# Altium schematic symbol library SCHLIB.SchLib: 2608 symbols (part 11 of 20)
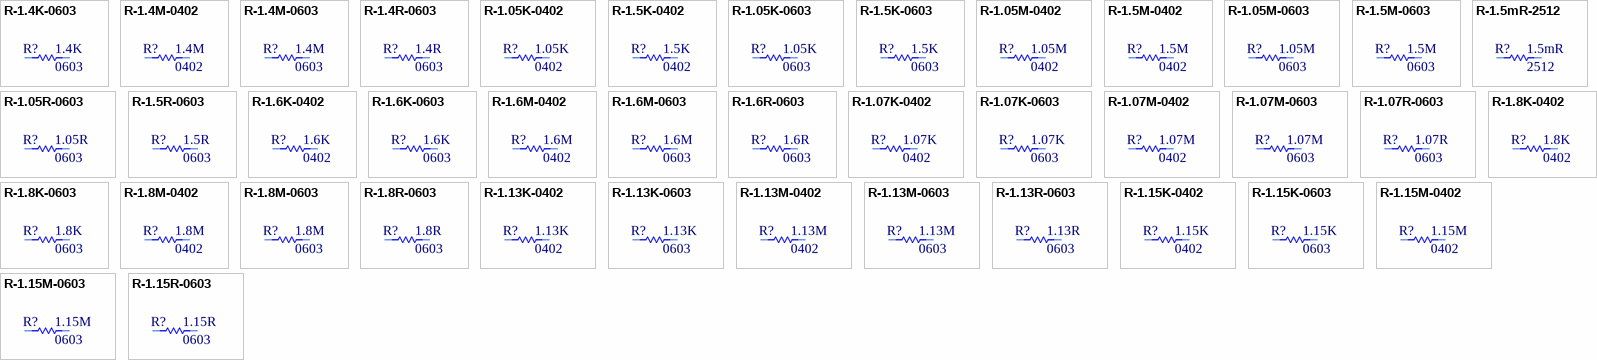
[diagram p93: symbols R-1.4K-0603 to R-1.15R-0603]

## R-1.05M-0603
designator R?, comment Package: 0603  (hidden comment: 1.05M)
RES SMD 1.05M OHM 1% 1/10W 0603; Manufacturer Part Number: CRCW06031M05FKEA; Manufacturer: Vishay Dale; Tolerance: 0.01; Power: 0.1W; Temperature Coefficient: ±100ppm/°C; Object  Type: Part; Design Item ID: R-1.05M-0603; Value: 1.05M; Composition: Thick Film; Features: Automotive AEC-Q200; Operating Temperature: -55°C ~ 155°C; Height - Seated (Max): 0.50mm; Category: Resistor
footprint R0603
pins: 1, 2

## R-1.5M-0603
designator R?, comment Package: 0603  (hidden comment: 1.5M)
RES SMD 1.5M OHM 1% 1/10W 0603; Manufacturer Part Number: CRCW06031M50FKEA; Manufacturer: Vishay Dale; Tolerance: 0.01; Power: 0.1W; Temperature Coefficient: ±100ppm/°C; Object  Type: Part; Design Item ID: R-1.5M-0603; Value: 1.5M; Composition: Thick Film; Features: Automotive AEC-Q200; Operating Temperature: -55°C ~ 155°C; Height - Seated (Max): 0.50mm; Category: Resistor
footprint R0603
pins: 1, 2

## R-1.5mR-2512
designator R?, comment Package: 2512  (hidden comment: 1.5mR)
RES 0.0015 OHM 1% 1W 2512; Manufacturer Part Number: WSL25121L500FEA; Manufacturer: Vishay Dale; Tolerance: 0.01; Temperature Coefficient: ±275ppm/°C; Object  Type: Part; Design Item ID: R-1.5mR-2512; Value: 1.5mR; Power: 1W; Composition: Metal Element; Features: Automotive AEC-Q200, Current Sense, Moisture Resistant, Pulse Withstanding; Operating Temperature: -65°C ~ 170°C; Height - Seated (Max): 0.89mm; Category: Resistor
footprint R2512
pins: 1, 2

## R-1.05R-0603
designator R?, comment Package: 0603  (hidden comment: 1.05R)
RES SMD 1.05 OHM 1% 1/10W 0603; Manufacturer Part Number: CRCW06031R05FKEA; Manufacturer: Vishay Dale; Tolerance: 0.01; Power: 0.1W; Temperature Coefficient: ±100ppm/°C; Object  Type: Part; Design Item ID: R-1.05R-0603; Value: 1.05R; Composition: Thick Film; Features: Automotive AEC-Q200; Operating Temperature: -55°C ~ 155°C; Height - Seated (Max): 0.50mm; Category: Resistor
footprint R0603
pins: 1, 2

## R-1.5R-0603
designator R?, comment Package: 0603  (hidden comment: 1.5R)
RES SMD 1.5 OHM 1% 1/10W 0603; Manufacturer Part Number: CRCW06031R50FKEA; Manufacturer: Vishay Dale; Tolerance: 0.01; Power: 0.1W; Temperature Coefficient: ±100ppm/°C; Object  Type: Part; Design Item ID: R-1.5R-0603; Value: 1.5R; Composition: Thick Film; Features: Automotive AEC-Q200; Operating Temperature: -55°C ~ 155°C; Height - Seated (Max): 0.50mm; Category: Resistor
footprint R0603
pins: 1, 2

## R-1.6K-0402
designator R?, comment Package: 0402  (hidden comment: 1.6K)
RES 1.6K OHM 1% 1/16W 0402; Manufacturer Part Number: RC0402FR-071K6L; Manufacturer: YAGEO; Tolerance: 0.01; Power: 0.063W; Temperature Coefficient: ±100ppm/°C; Object  Type: Part; Design Item ID: R-1.6K-0402; Value: 1.6K; Composition: Thick Film; Features: Moisture Resistant; Operating Temperature: -55°C ~ 155°C; Height - Seated (Max): 0.40mm; Category: Resistor
footprint R0402
pins: 1, 2

## R-1.6K-0603
designator R?, comment Package: 0603  (hidden comment: 1.6K)
RES SMD 1.6K OHM 1% 1/10W 0603; Manufacturer Part Number: CRCW06031K60FKEA; Manufacturer: Vishay Dale; Tolerance: 0.01; Power: 0.1W; Temperature Coefficient: ±100ppm/°C; Object  Type: Part; Design Item ID: R-1.6K-0603; Value: 1.6K; Composition: Thick Film; Features: Automotive AEC-Q200; Operating Temperature: -55°C ~ 155°C; Height - Seated (Max): 0.50mm; Category: Resistor
footprint R0603
pins: 1, 2

## R-1.6M-0402
designator R?, comment Package: 0402  (hidden comment: 1.6M)
RES 1.6M OHM 1% 1/16W 0402; Manufacturer Part Number: RC0402FR-071M6L; Manufacturer: YAGEO; Tolerance: 0.01; Power: 0.063W; Temperature Coefficient: ±100ppm/°C; Object  Type: Part; Design Item ID: R-1.6M-0402; Value: 1.6M; Composition: Thick Film; Features: Moisture Resistant; Operating Temperature: -55°C ~ 155°C; Height - Seated (Max): 0.40mm; Category: Resistor
footprint R0402
pins: 1, 2

## R-1.6M-0603
designator R?, comment Package: 0603  (hidden comment: 1.6M)
RES SMD 1.6M OHM 1% 1/10W 0603; Manufacturer Part Number: CRCW06031M60FKEA; Manufacturer: Vishay Dale; Tolerance: 0.01; Power: 0.1W; Temperature Coefficient: ±100ppm/°C; Object  Type: Part; Design Item ID: R-1.6M-0603; Value: 1.6M; Composition: Thick Film; Features: Automotive AEC-Q200; Operating Temperature: -55°C ~ 155°C; Height - Seated (Max): 0.50mm; Category: Resistor
footprint R0603
pins: 1, 2

## R-1.6R-0603
designator R?, comment Package: 0603  (hidden comment: 1.6R)
RES SMD 1.6 OHM 1% 1/10W 0603; Manufacturer Part Number: CRCW06031R60FKEA; Manufacturer: Vishay Dale; Tolerance: 0.01; Power: 0.1W; Temperature Coefficient: ±100ppm/°C; Object  Type: Part; Design Item ID: R-1.6R-0603; Value: 1.6R; Composition: Thick Film; Features: Automotive AEC-Q200; Operating Temperature: -55°C ~ 155°C; Height - Seated (Max): 0.50mm; Category: Resistor
footprint R0603
pins: 1, 2

## R-1.07K-0402
designator R?, comment Package: 0402  (hidden comment: 1.07K)
RES 1.07K OHM 1% 1/16W 0402; Manufacturer Part Number: RC0402FR-071K07L; Manufacturer: YAGEO; Tolerance: 0.01; Power: 0.063W; Temperature Coefficient: ±100ppm/°C; Object  Type: Part; Design Item ID: R-1.07K-0402; Value: 1.07K; Composition: Thick Film; Features: Moisture Resistant; Operating Temperature: -55°C ~ 155°C; Height - Seated (Max): 0.40mm; Category: Resistor
footprint R0402
pins: 1, 2

## R-1.07K-0603
designator R?, comment Package: 0603  (hidden comment: 1.07K)
RES SMD 1.07K OHM 1% 1/10W 0603; Manufacturer Part Number: CRCW06031K07FKEA; Manufacturer: Vishay Dale; Tolerance: 0.01; Power: 0.1W; Temperature Coefficient: ±100ppm/°C; Object  Type: Part; Design Item ID: R-1.07K-0603; Value: 1.07K; Composition: Thick Film; Features: Automotive AEC-Q200; Operating Temperature: -55°C ~ 155°C; Height - Seated (Max): 0.50mm; Category: Resistor
footprint R0603
pins: 1, 2

## R-1.07M-0402
designator R?, comment Package: 0402  (hidden comment: 1.07M)
RES 1.07M OHM 1% 1/16W 0402; Manufacturer Part Number: RC0402FR-071M07L; Manufacturer: YAGEO; Tolerance: 0.01; Power: 0.063W; Temperature Coefficient: ±100ppm/°C; Object  Type: Part; Design Item ID: R-1.07M-0402; Value: 1.07M; Composition: Thick Film; Features: Moisture Resistant; Operating Temperature: -55°C ~ 155°C; Height - Seated (Max): 0.40mm; Category: Resistor
footprint R0402
pins: 1, 2

## R-1.07M-0603
designator R?, comment Package: 0603  (hidden comment: 1.07M)
RES SMD 1.07M OHM 1% 1/10W 0603; Manufacturer Part Number: CRCW06031M07FKEA; Manufacturer: Vishay Dale; Tolerance: 0.01; Power: 0.1W; Temperature Coefficient: ±100ppm/°C; Object  Type: Part; Design Item ID: R-1.07M-0603; Value: 1.07M; Composition: Thick Film; Features: Automotive AEC-Q200; Operating Temperature: -55°C ~ 155°C; Height - Seated (Max): 0.50mm; Category: Resistor
footprint R0603
pins: 1, 2

## R-1.07R-0603
designator R?, comment Package: 0603  (hidden comment: 1.07R)
RES SMD 1.07 OHM 1% 1/10W 0603; Manufacturer Part Number: CRCW06031R07FKEA; Manufacturer: Vishay Dale; Tolerance: 0.01; Power: 0.1W; Temperature Coefficient: ±100ppm/°C; Object  Type: Part; Design Item ID: R-1.07R-0603; Value: 1.07R; Composition: Thick Film; Features: Automotive AEC-Q200; Operating Temperature: -55°C ~ 155°C; Height - Seated (Max): 0.50mm; Category: Resistor
footprint R0603
pins: 1, 2

## R-1.8K-0402
designator R?, comment Package: 0402  (hidden comment: 1.8K)
RES 1.8K OHM 1% 1/16W 0402; Manufacturer Part Number: RC0402FR-071K8L; Manufacturer: YAGEO; Tolerance: 0.01; Power: 0.063W; Temperature Coefficient: ±100ppm/°C; Object  Type: Part; Design Item ID: R-1.8K-0402; Value: 1.8K; Composition: Thick Film; Features: Moisture Resistant; Operating Temperature: -55°C ~ 155°C; Height - Seated (Max): 0.40mm; Category: Resistor
footprint R0402
pins: 1, 2

## R-1.8K-0603
designator R?, comment Package: 0603  (hidden comment: 1.8K)
RES SMD 1.8K OHM 1% 1/10W 0603; Manufacturer Part Number: CRCW06031K80FKEA; Manufacturer: Vishay Dale; Tolerance: 0.01; Power: 0.1W; Temperature Coefficient: ±100ppm/°C; Object  Type: Part; Design Item ID: R-1.8K-0603; Value: 1.8K; Composition: Thick Film; Features: Automotive AEC-Q200; Operating Temperature: -55°C ~ 155°C; Height - Seated (Max): 0.50mm; Category: Resistor
footprint R0603
pins: 1, 2

## R-1.8M-0402
designator R?, comment Package: 0402  (hidden comment: 1.8M)
RES 1.8M OHM 1% 1/16W 0402; Manufacturer Part Number: RC0402FR-071M8L; Manufacturer: YAGEO; Tolerance: 0.01; Power: 0.063W; Temperature Coefficient: ±100ppm/°C; Object  Type: Part; Design Item ID: R-1.8M-0402; Value: 1.8M; Composition: Thick Film; Features: Moisture Resistant; Operating Temperature: -55°C ~ 155°C; Height - Seated (Max): 0.40mm; Category: Resistor
footprint R0402
pins: 1, 2

## R-1.8M-0603
designator R?, comment Package: 0603  (hidden comment: 1.8M)
RES SMD 1.8M OHM 1% 1/10W 0603; Manufacturer Part Number: CRCW06031M80FKEA; Manufacturer: Vishay Dale; Tolerance: 0.01; Power: 0.1W; Temperature Coefficient: ±100ppm/°C; Object  Type: Part; Design Item ID: R-1.8M-0603; Value: 1.8M; Composition: Thick Film; Features: Automotive AEC-Q200; Operating Temperature: -55°C ~ 155°C; Height - Seated (Max): 0.50mm; Category: Resistor
footprint R0603
pins: 1, 2

## R-1.8R-0603
designator R?, comment Package: 0603  (hidden comment: 1.8R)
RES SMD 1.8 OHM 1% 1/10W 0603; Manufacturer Part Number: CRCW06031R80FKEA; Manufacturer: Vishay Dale; Tolerance: 0.01; Power: 0.1W; Temperature Coefficient: ±100ppm/°C; Object  Type: Part; Design Item ID: R-1.8R-0603; Value: 1.8R; Composition: Thick Film; Features: Automotive AEC-Q200; Operating Temperature: -55°C ~ 155°C; Height - Seated (Max): 0.50mm; Category: Resistor
footprint R0603
pins: 1, 2

## R-1.13K-0402
designator R?, comment Package: 0402  (hidden comment: 1.13K)
RES 1.13K OHM 1% 1/16W 0402; Manufacturer Part Number: RC0402FR-071K13L; Manufacturer: YAGEO; Tolerance: 0.01; Power: 0.063W; Temperature Coefficient: ±100ppm/°C; Object  Type: Part; Design Item ID: R-1.13K-0402; Value: 1.13K; Composition: Thick Film; Features: Moisture Resistant; Operating Temperature: -55°C ~ 155°C; Height - Seated (Max): 0.40mm; Category: Resistor
footprint R0402
pins: 1, 2

## R-1.13K-0603
designator R?, comment Package: 0603  (hidden comment: 1.13K)
RES SMD 1.13K OHM 1% 1/10W 0603; Manufacturer Part Number: CRCW06031K13FKEA; Manufacturer: Vishay Dale; Tolerance: 0.01; Power: 0.1W; Temperature Coefficient: ±100ppm/°C; Object  Type: Part; Design Item ID: R-1.13K-0603; Value: 1.13K; Composition: Thick Film; Features: Automotive AEC-Q200; Operating Temperature: -55°C ~ 155°C; Height - Seated (Max): 0.50mm; Category: Resistor
footprint R0603
pins: 1, 2

## R-1.13M-0402
designator R?, comment Package: 0402  (hidden comment: 1.13M)
RES 1.13M OHM 1% 1/16W 0402; Manufacturer Part Number: RC0402FR-071M13L; Manufacturer: YAGEO; Tolerance: 0.01; Power: 0.063W; Temperature Coefficient: ±100ppm/°C; Object  Type: Part; Design Item ID: R-1.13M-0402; Value: 1.13M; Composition: Thick Film; Features: Moisture Resistant; Operating Temperature: -55°C ~ 155°C; Height - Seated (Max): 0.40mm; Category: Resistor
footprint R0402
pins: 1, 2

## R-1.13M-0603
designator R?, comment Package: 0603  (hidden comment: 1.13M)
RES SMD 1.13M OHM 1% 1/10W 0603; Manufacturer Part Number: CRCW06031M13FKEA; Manufacturer: Vishay Dale; Tolerance: 0.01; Power: 0.1W; Temperature Coefficient: ±100ppm/°C; Object  Type: Part; Design Item ID: R-1.13M-0603; Value: 1.13M; Composition: Thick Film; Features: Automotive AEC-Q200; Operating Temperature: -55°C ~ 155°C; Height - Seated (Max): 0.50mm; Category: Resistor
footprint R0603
pins: 1, 2

## R-1.13R-0603
designator R?, comment Package: 0603  (hidden comment: 1.13R)
RES SMD 1.13 OHM 1% 1/10W 0603; Manufacturer Part Number: CRCW06031R13FKEA; Manufacturer: Vishay Dale; Tolerance: 0.01; Power: 0.1W; Temperature Coefficient: ±100ppm/°C; Object  Type: Part; Design Item ID: R-1.13R-0603; Value: 1.13R; Composition: Thick Film; Features: Automotive AEC-Q200; Operating Temperature: -55°C ~ 155°C; Height - Seated (Max): 0.50mm; Category: Resistor
footprint R0603
pins: 1, 2

## R-1.15K-0402
designator R?, comment Package: 0402  (hidden comment: 1.15K)
RES 1.15K OHM 1% 1/16W 0402; Manufacturer Part Number: RC0402FR-071K15L; Manufacturer: YAGEO; Tolerance: 0.01; Power: 0.063W; Temperature Coefficient: ±100ppm/°C; Object  Type: Part; Design Item ID: R-1.15K-0402; Value: 1.15K; Composition: Thick Film; Features: Moisture Resistant; Operating Temperature: -55°C ~ 155°C; Height - Seated (Max): 0.40mm; Category: Resistor
footprint R0402
pins: 1, 2

## R-1.15K-0603
designator R?, comment Package: 0603  (hidden comment: 1.15K)
RES SMD 1.15K OHM 1% 1/10W 0603; Manufacturer Part Number: CRCW06031K15FKEA; Manufacturer: Vishay Dale; Tolerance: 0.01; Power: 0.1W; Temperature Coefficient: ±100ppm/°C; Object  Type: Part; Design Item ID: R-1.15K-0603; Value: 1.15K; Composition: Thick Film; Features: Automotive AEC-Q200; Operating Temperature: -55°C ~ 155°C; Height - Seated (Max): 0.50mm; Category: Resistor
footprint R0603
pins: 1, 2

## R-1.15M-0402
designator R?, comment Package: 0402  (hidden comment: 1.15M)
RES 1.15M OHM 1% 1/16W 0402; Manufacturer Part Number: RC0402FR-071M15L; Manufacturer: YAGEO; Tolerance: 0.01; Power: 0.063W; Temperature Coefficient: ±100ppm/°C; Object  Type: Part; Design Item ID: R-1.15M-0402; Value: 1.15M; Composition: Thick Film; Features: Moisture Resistant; Operating Temperature: -55°C ~ 155°C; Height - Seated (Max): 0.40mm; Category: Resistor
footprint R0402
pins: 1, 2

## R-1.15M-0603
designator R?, comment Package: 0603  (hidden comment: 1.15M)
RES SMD 1.15M OHM 1% 1/10W 0603; Manufacturer Part Number: CRCW06031M15FKEA; Manufacturer: Vishay Dale; Tolerance: 0.01; Power: 0.1W; Temperature Coefficient: ±100ppm/°C; Object  Type: Part; Design Item ID: R-1.15M-0603; Value: 1.15M; Composition: Thick Film; Features: Automotive AEC-Q200; Operating Temperature: -55°C ~ 155°C; Height - Seated (Max): 0.50mm; Category: Resistor
footprint R0603
pins: 1, 2

## R-1.15R-0603
designator R?, comment Package: 0603  (hidden comment: 1.15R)
RES SMD 1.15 OHM 1% 1/10W 0603; Manufacturer Part Number: CRCW06031R15FKEA; Manufacturer: Vishay Dale; Tolerance: 0.01; Power: 0.1W; Temperature Coefficient: ±100ppm/°C; Object  Type: Part; Design Item ID: R-1.15R-0603; Value: 1.15R; Composition: Thick Film; Features: Automotive AEC-Q200; Operating Temperature: -55°C ~ 155°C; Height - Seated (Max): 0.50mm; Category: Resistor
footprint R0603
pins: 1, 2

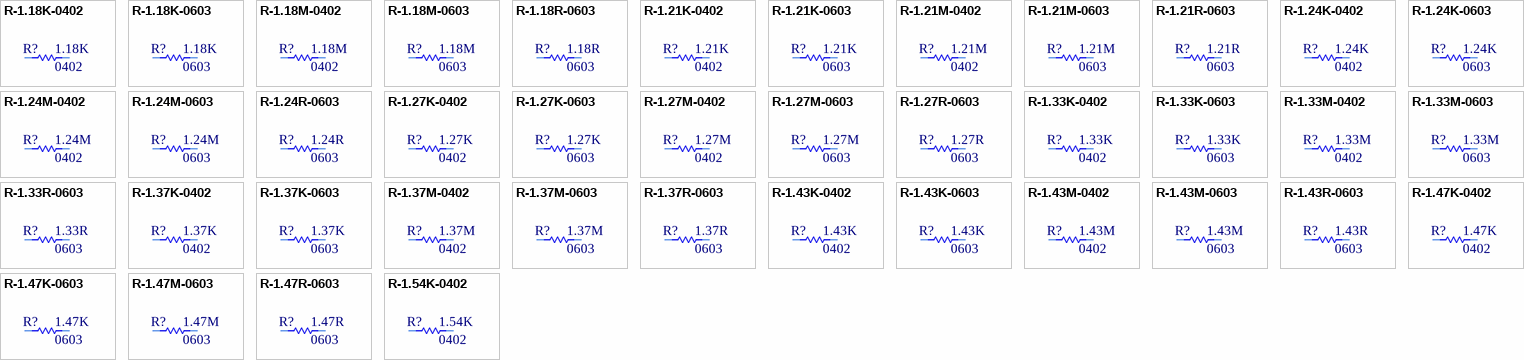
[diagram p45: symbols R-1.18K-0402 to R-1.54K-0402]

## R-1.18K-0402
designator R?, comment Package: 0402  (hidden comment: 1.18K)
RES 1.18K OHM 1% 1/16W 0402; Manufacturer Part Number: RC0402FR-071K18L; Manufacturer: YAGEO; Tolerance: 0.01; Power: 0.063W; Temperature Coefficient: ±100ppm/°C; Object  Type: Part; Design Item ID: R-1.18K-0402; Value: 1.18K; Composition: Thick Film; Features: Moisture Resistant; Operating Temperature: -55°C ~ 155°C; Height - Seated (Max): 0.40mm; Category: Resistor
footprint R0402
pins: 1, 2

## R-1.18K-0603
designator R?, comment Package: 0603  (hidden comment: 1.18K)
RES SMD 1.18K OHM 1% 1/10W 0603; Manufacturer Part Number: CRCW06031K18FKEA; Manufacturer: Vishay Dale; Tolerance: 0.01; Power: 0.1W; Temperature Coefficient: ±100ppm/°C; Object  Type: Part; Design Item ID: R-1.18K-0603; Value: 1.18K; Composition: Thick Film; Features: Automotive AEC-Q200; Operating Temperature: -55°C ~ 155°C; Height - Seated (Max): 0.50mm; Category: Resistor
footprint R0603
pins: 1, 2

## R-1.18M-0402
designator R?, comment Package: 0402  (hidden comment: 1.18M)
RES 1.18M OHM 1% 1/16W 0402; Manufacturer Part Number: RC0402FR-071M18L; Manufacturer: YAGEO; Tolerance: 0.01; Power: 0.063W; Temperature Coefficient: ±100ppm/°C; Object  Type: Part; Design Item ID: R-1.18M-0402; Value: 1.18M; Composition: Thick Film; Features: Moisture Resistant; Operating Temperature: -55°C ~ 155°C; Height - Seated (Max): 0.40mm; Category: Resistor
footprint R0402
pins: 1, 2

## R-1.18M-0603
designator R?, comment Package: 0603  (hidden comment: 1.18M)
RES SMD 1.18M OHM 1% 1/10W 0603; Manufacturer Part Number: CRCW06031M18FKEA; Manufacturer: Vishay Dale; Tolerance: 0.01; Power: 0.1W; Temperature Coefficient: ±100ppm/°C; Object  Type: Part; Design Item ID: R-1.18M-0603; Value: 1.18M; Composition: Thick Film; Features: Automotive AEC-Q200; Operating Temperature: -55°C ~ 155°C; Height - Seated (Max): 0.50mm; Category: Resistor
footprint R0603
pins: 1, 2

## R-1.18R-0603
designator R?, comment Package: 0603  (hidden comment: 1.18R)
RES SMD 1.18 OHM 1% 1/10W 0603; Manufacturer Part Number: CRCW06031R18FKEA; Manufacturer: Vishay Dale; Tolerance: 0.01; Power: 0.1W; Temperature Coefficient: ±100ppm/°C; Object  Type: Part; Design Item ID: R-1.18R-0603; Value: 1.18R; Composition: Thick Film; Features: Automotive AEC-Q200; Operating Temperature: -55°C ~ 155°C; Height - Seated (Max): 0.50mm; Category: Resistor
footprint R0603
pins: 1, 2

## R-1.21K-0402
designator R?, comment Package: 0402  (hidden comment: 1.21K)
RES 1.21K OHM 1% 1/16W 0402; Manufacturer Part Number: RC0402FR-071K21L; Manufacturer: YAGEO; Tolerance: 0.01; Power: 0.063W; Temperature Coefficient: ±100ppm/°C; Object  Type: Part; Design Item ID: R-1.21K-0402; Value: 1.21K; Composition: Thick Film; Features: Moisture Resistant; Operating Temperature: -55°C ~ 155°C; Height - Seated (Max): 0.40mm; Category: Resistor
footprint R0402
pins: 1, 2

## R-1.21K-0603
designator R?, comment Package: 0603  (hidden comment: 1.21K)
RES SMD 1.21K OHM 1% 1/10W 0603; Manufacturer Part Number: CRCW06031K21FKEA; Manufacturer: Vishay Dale; Tolerance: 0.01; Power: 0.1W; Temperature Coefficient: ±100ppm/°C; Object  Type: Part; Design Item ID: R-1.21K-0603; Value: 1.21K; Composition: Thick Film; Features: Automotive AEC-Q200; Operating Temperature: -55°C ~ 155°C; Height - Seated (Max): 0.50mm; Category: Resistor
footprint R0603
pins: 1, 2

## R-1.21M-0402
designator R?, comment Package: 0402  (hidden comment: 1.21M)
RES 1.21M OHM 1% 1/16W 0402; Manufacturer Part Number: RC0402FR-071M21L; Manufacturer: YAGEO; Tolerance: 0.01; Power: 0.063W; Temperature Coefficient: ±100ppm/°C; Object  Type: Part; Design Item ID: R-1.21M-0402; Value: 1.21M; Composition: Thick Film; Features: Moisture Resistant; Operating Temperature: -55°C ~ 155°C; Height - Seated (Max): 0.40mm; Category: Resistor
footprint R0402
pins: 1, 2

## R-1.21M-0603
designator R?, comment Package: 0603  (hidden comment: 1.21M)
RES SMD 1.21M OHM 1% 1/10W 0603; Manufacturer Part Number: CRCW06031M21FKEA; Manufacturer: Vishay Dale; Tolerance: 0.01; Power: 0.1W; Temperature Coefficient: ±100ppm/°C; Object  Type: Part; Design Item ID: R-1.21M-0603; Value: 1.21M; Composition: Thick Film; Features: Automotive AEC-Q200; Operating Temperature: -55°C ~ 155°C; Height - Seated (Max): 0.50mm; Category: Resistor
footprint R0603
pins: 1, 2

## R-1.21R-0603
designator R?, comment Package: 0603  (hidden comment: 1.21R)
RES SMD 1.21 OHM 1% 1/10W 0603; Manufacturer Part Number: CRCW06031R21FKEA; Manufacturer: Vishay Dale; Tolerance: 0.01; Power: 0.1W; Temperature Coefficient: ±100ppm/°C; Object  Type: Part; Design Item ID: R-1.21R-0603; Value: 1.21R; Composition: Thick Film; Features: Automotive AEC-Q200; Operating Temperature: -55°C ~ 155°C; Height - Seated (Max): 0.50mm; Category: Resistor
footprint R0603
pins: 1, 2

## R-1.24K-0402
designator R?, comment Package: 0402  (hidden comment: 1.24K)
RES 1.24K OHM 1% 1/16W 0402; Manufacturer Part Number: RC0402FR-071K24L; Manufacturer: YAGEO; Tolerance: 0.01; Power: 0.063W; Temperature Coefficient: ±100ppm/°C; Object  Type: Part; Design Item ID: R-1.24K-0402; Value: 1.24K; Composition: Thick Film; Features: Moisture Resistant; Operating Temperature: -55°C ~ 155°C; Height - Seated (Max): 0.40mm; Category: Resistor
footprint R0402
pins: 1, 2

## R-1.24K-0603
designator R?, comment Package: 0603  (hidden comment: 1.24K)
RES SMD 1.24K OHM 1% 1/10W 0603; Manufacturer Part Number: CRCW06031K24FKEA; Manufacturer: Vishay Dale; Tolerance: 0.01; Power: 0.1W; Temperature Coefficient: ±100ppm/°C; Object  Type: Part; Design Item ID: R-1.24K-0603; Value: 1.24K; Composition: Thick Film; Features: Automotive AEC-Q200; Operating Temperature: -55°C ~ 155°C; Height - Seated (Max): 0.50mm; Category: Resistor
footprint R0603
pins: 1, 2

## R-1.24M-0402
designator R?, comment Package: 0402  (hidden comment: 1.24M)
RES 1.24M OHM 1% 1/16W 0402; Manufacturer Part Number: RC0402FR-071M24L; Manufacturer: YAGEO; Tolerance: 0.01; Power: 0.063W; Temperature Coefficient: ±100ppm/°C; Object  Type: Part; Design Item ID: R-1.24M-0402; Value: 1.24M; Composition: Thick Film; Features: Moisture Resistant; Operating Temperature: -55°C ~ 155°C; Height - Seated (Max): 0.40mm; Category: Resistor
footprint R0402
pins: 1, 2

## R-1.24M-0603
designator R?, comment Package: 0603  (hidden comment: 1.24M)
RES SMD 1.24M OHM 1% 1/10W 0603; Manufacturer Part Number: CRCW06031M24FKEA; Manufacturer: Vishay Dale; Tolerance: 0.01; Power: 0.1W; Temperature Coefficient: ±100ppm/°C; Object  Type: Part; Design Item ID: R-1.24M-0603; Value: 1.24M; Composition: Thick Film; Features: Automotive AEC-Q200; Operating Temperature: -55°C ~ 155°C; Height - Seated (Max): 0.50mm; Category: Resistor
footprint R0603
pins: 1, 2

## R-1.24R-0603
designator R?, comment Package: 0603  (hidden comment: 1.24R)
RES SMD 1.24 OHM 1% 1/10W 0603; Manufacturer Part Number: CRCW06031R24FKEA; Manufacturer: Vishay Dale; Tolerance: 0.01; Power: 0.1W; Temperature Coefficient: ±100ppm/°C; Object  Type: Part; Design Item ID: R-1.24R-0603; Value: 1.24R; Composition: Thick Film; Features: Automotive AEC-Q200; Operating Temperature: -55°C ~ 155°C; Height - Seated (Max): 0.50mm; Category: Resistor
footprint R0603
pins: 1, 2

## R-1.27K-0402
designator R?, comment Package: 0402  (hidden comment: 1.27K)
RES 1.27K OHM 1% 1/16W 0402; Manufacturer Part Number: RC0402FR-071K27L; Manufacturer: YAGEO; Tolerance: 0.01; Power: 0.063W; Temperature Coefficient: ±100ppm/°C; Object  Type: Part; Design Item ID: R-1.27K-0402; Value: 1.27K; Composition: Thick Film; Features: Moisture Resistant; Operating Temperature: -55°C ~ 155°C; Height - Seated (Max): 0.40mm; Category: Resistor
footprint R0402
pins: 1, 2

## R-1.27K-0603
designator R?, comment Package: 0603  (hidden comment: 1.27K)
RES SMD 1.27K OHM 1% 1/10W 0603; Manufacturer Part Number: CRCW06031K27FKEA; Manufacturer: Vishay Dale; Tolerance: 0.01; Power: 0.1W; Temperature Coefficient: ±100ppm/°C; Object  Type: Part; Design Item ID: R-1.27K-0603; Value: 1.27K; Composition: Thick Film; Features: Automotive AEC-Q200; Operating Temperature: -55°C ~ 155°C; Height - Seated (Max): 0.50mm; Category: Resistor
footprint R0603
pins: 1, 2

## R-1.27M-0402
designator R?, comment Package: 0402  (hidden comment: 1.27M)
RES 1.27M OHM 1% 1/16W 0402; Manufacturer Part Number: RC0402FR-071M27L; Manufacturer: YAGEO; Tolerance: 0.01; Power: 0.063W; Temperature Coefficient: ±100ppm/°C; Object  Type: Part; Design Item ID: R-1.27M-0402; Value: 1.27M; Composition: Thick Film; Features: Moisture Resistant; Operating Temperature: -55°C ~ 155°C; Height - Seated (Max): 0.40mm; Category: Resistor
footprint R0402
pins: 1, 2

## R-1.27M-0603
designator R?, comment Package: 0603  (hidden comment: 1.27M)
RES SMD 1.27M OHM 1% 1/10W 0603; Manufacturer Part Number: CRCW06031M27FKEA; Manufacturer: Vishay Dale; Tolerance: 0.01; Power: 0.1W; Temperature Coefficient: ±100ppm/°C; Object  Type: Part; Design Item ID: R-1.27M-0603; Value: 1.27M; Composition: Thick Film; Features: Automotive AEC-Q200; Operating Temperature: -55°C ~ 155°C; Height - Seated (Max): 0.50mm; Category: Resistor
footprint R0603
pins: 1, 2

## R-1.27R-0603
designator R?, comment Package: 0603  (hidden comment: 1.27R)
RES SMD 1.27 OHM 1% 1/10W 0603; Manufacturer Part Number: CRCW06031R27FKEA; Manufacturer: Vishay Dale; Tolerance: 0.01; Power: 0.1W; Temperature Coefficient: ±100ppm/°C; Object  Type: Part; Design Item ID: R-1.27R-0603; Value: 1.27R; Composition: Thick Film; Features: Automotive AEC-Q200; Operating Temperature: -55°C ~ 155°C; Height - Seated (Max): 0.50mm; Category: Resistor
footprint R0603
pins: 1, 2

## R-1.33K-0402
designator R?, comment Package: 0402  (hidden comment: 1.33K)
RES 1.33K OHM 1% 1/16W 0402; Manufacturer Part Number: RC0402FR-071K33L; Manufacturer: YAGEO; Tolerance: 0.01; Power: 0.063W; Temperature Coefficient: ±100ppm/°C; Object  Type: Part; Design Item ID: R-1.33K-0402; Value: 1.33K; Composition: Thick Film; Features: Moisture Resistant; Operating Temperature: -55°C ~ 155°C; Height - Seated (Max): 0.40mm; Category: Resistor
footprint R0402
pins: 1, 2

## R-1.33K-0603
designator R?, comment Package: 0603  (hidden comment: 1.33K)
RES SMD 1.33K OHM 1% 1/10W 0603; Manufacturer Part Number: CRCW06031K33FKEA; Manufacturer: Vishay Dale; Tolerance: 0.01; Power: 0.1W; Temperature Coefficient: ±100ppm/°C; Object  Type: Part; Design Item ID: R-1.33K-0603; Value: 1.33K; Composition: Thick Film; Features: Automotive AEC-Q200; Operating Temperature: -55°C ~ 155°C; Height - Seated (Max): 0.50mm; Category: Resistor
footprint R0603
pins: 1, 2

## R-1.33M-0402
designator R?, comment Package: 0402  (hidden comment: 1.33M)
RES 1.33M OHM 1% 1/16W 0402; Manufacturer Part Number: RC0402FR-071M33L; Manufacturer: YAGEO; Tolerance: 0.01; Power: 0.063W; Temperature Coefficient: ±100ppm/°C; Object  Type: Part; Design Item ID: R-1.33M-0402; Value: 1.33M; Composition: Thick Film; Features: Moisture Resistant; Operating Temperature: -55°C ~ 155°C; Height - Seated (Max): 0.40mm; Category: Resistor
footprint R0402
pins: 1, 2

## R-1.33M-0603
designator R?, comment Package: 0603  (hidden comment: 1.33M)
RES SMD 1.33M OHM 1% 1/10W 0603; Manufacturer Part Number: CRCW06031M33FKEA; Manufacturer: Vishay Dale; Tolerance: 0.01; Power: 0.1W; Temperature Coefficient: ±100ppm/°C; Object  Type: Part; Design Item ID: R-1.33M-0603; Value: 1.33M; Composition: Thick Film; Features: Automotive AEC-Q200; Operating Temperature: -55°C ~ 155°C; Height - Seated (Max): 0.50mm; Category: Resistor
footprint R0603
pins: 1, 2

## R-1.33R-0603
designator R?, comment Package: 0603  (hidden comment: 1.33R)
RES SMD 1.33 OHM 1% 1/10W 0603; Manufacturer Part Number: CRCW06031R33FKEA; Manufacturer: Vishay Dale; Tolerance: 0.01; Power: 0.1W; Temperature Coefficient: ±100ppm/°C; Object  Type: Part; Design Item ID: R-1.33R-0603; Value: 1.33R; Composition: Thick Film; Features: Automotive AEC-Q200; Operating Temperature: -55°C ~ 155°C; Height - Seated (Max): 0.50mm; Category: Resistor
footprint R0603
pins: 1, 2

## R-1.37K-0402
designator R?, comment Package: 0402  (hidden comment: 1.37K)
RES 1.37K OHM 1% 1/16W 0402; Manufacturer Part Number: RC0402FR-071K37L; Manufacturer: YAGEO; Tolerance: 0.01; Power: 0.063W; Temperature Coefficient: ±100ppm/°C; Object  Type: Part; Design Item ID: R-1.37K-0402; Value: 1.37K; Composition: Thick Film; Features: Moisture Resistant; Operating Temperature: -55°C ~ 155°C; Height - Seated (Max): 0.40mm; Category: Resistor
footprint R0402
pins: 1, 2

## R-1.37K-0603
designator R?, comment Package: 0603  (hidden comment: 1.37K)
RES SMD 1.37K OHM 1% 1/10W 0603; Manufacturer Part Number: CRCW06031K37FKEA; Manufacturer: Vishay Dale; Tolerance: 0.01; Power: 0.1W; Temperature Coefficient: ±100ppm/°C; Object  Type: Part; Design Item ID: R-1.37K-0603; Value: 1.37K; Composition: Thick Film; Features: Automotive AEC-Q200; Operating Temperature: -55°C ~ 155°C; Height - Seated (Max): 0.50mm; Category: Resistor
footprint R0603
pins: 1, 2

## R-1.37M-0402
designator R?, comment Package: 0402  (hidden comment: 1.37M)
RES 1.37M OHM 1% 1/16W 0402; Manufacturer Part Number: RC0402FR-071M37L; Manufacturer: YAGEO; Tolerance: 0.01; Power: 0.063W; Temperature Coefficient: ±100ppm/°C; Object  Type: Part; Design Item ID: R-1.37M-0402; Value: 1.37M; Composition: Thick Film; Features: Moisture Resistant; Operating Temperature: -55°C ~ 155°C; Height - Seated (Max): 0.40mm; Category: Resistor
footprint R0402
pins: 1, 2

## R-1.37M-0603
designator R?, comment Package: 0603  (hidden comment: 1.37M)
RES SMD 1.37M OHM 1% 1/10W 0603; Manufacturer Part Number: CRCW06031M37FKEA; Manufacturer: Vishay Dale; Tolerance: 0.01; Power: 0.1W; Temperature Coefficient: ±100ppm/°C; Object  Type: Part; Design Item ID: R-1.37M-0603; Value: 1.37M; Composition: Thick Film; Features: Automotive AEC-Q200; Operating Temperature: -55°C ~ 155°C; Height - Seated (Max): 0.50mm; Category: Resistor
footprint R0603
pins: 1, 2

## R-1.37R-0603
designator R?, comment Package: 0603  (hidden comment: 1.37R)
RES SMD 1.37 OHM 1% 1/10W 0603; Manufacturer Part Number: CRCW06031R37FKEA; Manufacturer: Vishay Dale; Tolerance: 0.01; Power: 0.1W; Temperature Coefficient: ±100ppm/°C; Object  Type: Part; Design Item ID: R-1.37R-0603; Value: 1.37R; Composition: Thick Film; Features: Automotive AEC-Q200; Operating Temperature: -55°C ~ 155°C; Height - Seated (Max): 0.50mm; Category: Resistor
footprint R0603
pins: 1, 2

## R-1.43K-0402
designator R?, comment Package: 0402  (hidden comment: 1.43K)
RES 1.43K OHM 1% 1/16W 0402; Manufacturer Part Number: RC0402FR-071K43L; Manufacturer: YAGEO; Tolerance: 0.01; Power: 0.063W; Temperature Coefficient: ±100ppm/°C; Object  Type: Part; Design Item ID: R-1.43K-0402; Value: 1.43K; Composition: Thick Film; Features: Moisture Resistant; Operating Temperature: -55°C ~ 155°C; Height - Seated (Max): 0.40mm; Category: Resistor
footprint R0402
pins: 1, 2

## R-1.43K-0603
designator R?, comment Package: 0603  (hidden comment: 1.43K)
RES SMD 1.43K OHM 1% 1/10W 0603; Manufacturer Part Number: CRCW06031K43FKEA; Manufacturer: Vishay Dale; Tolerance: 0.01; Power: 0.1W; Temperature Coefficient: ±100ppm/°C; Object  Type: Part; Design Item ID: R-1.43K-0603; Value: 1.43K; Composition: Thick Film; Features: Automotive AEC-Q200; Operating Temperature: -55°C ~ 155°C; Height - Seated (Max): 0.50mm; Category: Resistor
footprint R0603
pins: 1, 2

## R-1.43M-0402
designator R?, comment Package: 0402  (hidden comment: 1.43M)
RES 1.43M OHM 1% 1/16W 0402; Manufacturer Part Number: RC0402FR-071M43L; Manufacturer: YAGEO; Tolerance: 0.01; Power: 0.063W; Temperature Coefficient: ±100ppm/°C; Object  Type: Part; Design Item ID: R-1.43M-0402; Value: 1.43M; Composition: Thick Film; Features: Moisture Resistant; Operating Temperature: -55°C ~ 155°C; Height - Seated (Max): 0.40mm; Category: Resistor
footprint R0402
pins: 1, 2

## R-1.43M-0603
designator R?, comment Package: 0603  (hidden comment: 1.43M)
RES SMD 1.43M OHM 1% 1/10W 0603; Manufacturer Part Number: CRCW06031M43FKEA; Manufacturer: Vishay Dale; Tolerance: 0.01; Power: 0.1W; Temperature Coefficient: ±100ppm/°C; Object  Type: Part; Design Item ID: R-1.43M-0603; Value: 1.43M; Composition: Thick Film; Features: Automotive AEC-Q200; Operating Temperature: -55°C ~ 155°C; Height - Seated (Max): 0.50mm; Category: Resistor
footprint R0603
pins: 1, 2

## R-1.43R-0603
designator R?, comment Package: 0603  (hidden comment: 1.43R)
RES SMD 1.43 OHM 1% 1/10W 0603; Manufacturer Part Number: CRCW06031R43FKEA; Manufacturer: Vishay Dale; Tolerance: 0.01; Power: 0.1W; Temperature Coefficient: ±100ppm/°C; Object  Type: Part; Design Item ID: R-1.43R-0603; Value: 1.43R; Composition: Thick Film; Features: Automotive AEC-Q200; Operating Temperature: -55°C ~ 155°C; Height - Seated (Max): 0.50mm; Category: Resistor
footprint R0603
pins: 1, 2

## R-1.47K-0402
designator R?, comment Package: 0402  (hidden comment: 1.47K)
RES 1.47K OHM 1% 1/16W 0402; Manufacturer Part Number: RC0402FR-071K47L; Manufacturer: YAGEO; Tolerance: 0.01; Power: 0.063W; Temperature Coefficient: ±100ppm/°C; Object  Type: Part; Design Item ID: R-1.47K-0402; Value: 1.47K; Composition: Thick Film; Features: Moisture Resistant; Operating Temperature: -55°C ~ 155°C; Height - Seated (Max): 0.40mm; Category: Resistor
footprint R0402
pins: 1, 2

## R-1.47K-0603
designator R?, comment Package: 0603  (hidden comment: 1.47K)
RES SMD 1.47K OHM 1% 1/10W 0603; Manufacturer Part Number: CRCW06031K47FKEA; Manufacturer: Vishay Dale; Tolerance: 0.01; Power: 0.1W; Temperature Coefficient: ±100ppm/°C; Object  Type: Part; Design Item ID: R-1.47K-0603; Value: 1.47K; Composition: Thick Film; Features: Automotive AEC-Q200; Operating Temperature: -55°C ~ 155°C; Height - Seated (Max): 0.50mm; Category: Resistor
footprint R0603
pins: 1, 2

## R-1.47M-0603
designator R?, comment Package: 0603  (hidden comment: 1.47M)
RES SMD 1.47M OHM 1% 1/10W 0603; Manufacturer Part Number: CRCW06031M47FKEA; Manufacturer: Vishay Dale; Tolerance: 0.01; Power: 0.1W; Temperature Coefficient: ±100ppm/°C; Object  Type: Part; Design Item ID: R-1.47M-0603; Value: 1.47M; Composition: Thick Film; Features: Automotive AEC-Q200; Operating Temperature: -55°C ~ 155°C; Height - Seated (Max): 0.50mm; Category: Resistor
footprint R0603
pins: 1, 2

## R-1.47R-0603
designator R?, comment Package: 0603  (hidden comment: 1.47R)
RES SMD 1.47 OHM 1% 1/10W 0603; Manufacturer Part Number: CRCW06031R47FKEA; Manufacturer: Vishay Dale; Tolerance: 0.01; Power: 0.1W; Temperature Coefficient: ±100ppm/°C; Object  Type: Part; Design Item ID: R-1.47R-0603; Value: 1.47R; Composition: Thick Film; Features: Automotive AEC-Q200; Operating Temperature: -55°C ~ 155°C; Height - Seated (Max): 0.50mm; Category: Resistor
footprint R0603
pins: 1, 2

## R-1.54K-0402
designator R?, comment Package: 0402  (hidden comment: 1.54K)
RES 1.54K OHM 1% 1/16W 0402; Manufacturer Part Number: RC0402FR-071K54L; Manufacturer: YAGEO; Tolerance: 0.01; Power: 0.063W; Temperature Coefficient: ±100ppm/°C; Object  Type: Part; Design Item ID: R-1.54K-0402; Value: 1.54K; Composition: Thick Film; Features: Moisture Resistant; Operating Temperature: -55°C ~ 155°C; Height - Seated (Max): 0.40mm; Category: Resistor
footprint R0402
pins: 1, 2

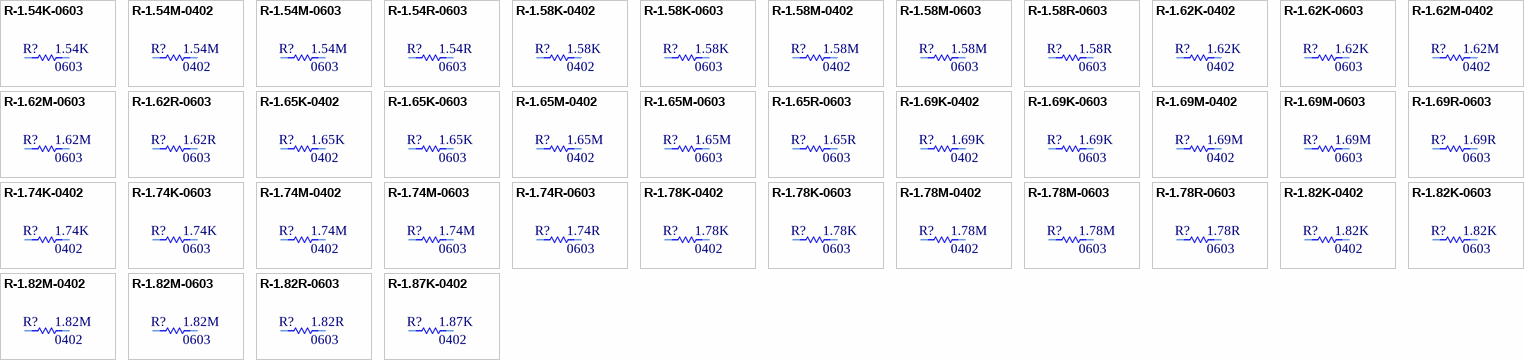
[diagram p46: symbols R-1.54K-0603 to R-1.87K-0402]

## R-1.54K-0603
designator R?, comment Package: 0603  (hidden comment: 1.54K)
RES SMD 1.54K OHM 1% 1/10W 0603; Manufacturer Part Number: CRCW06031K54FKEA; Manufacturer: Vishay Dale; Tolerance: 0.01; Power: 0.1W; Temperature Coefficient: ±100ppm/°C; Object  Type: Part; Design Item ID: R-1.54K-0603; Value: 1.54K; Composition: Thick Film; Features: Automotive AEC-Q200; Operating Temperature: -55°C ~ 155°C; Height - Seated (Max): 0.50mm; Category: Resistor
footprint R0603
pins: 1, 2

## R-1.54M-0402
designator R?, comment Package: 0402  (hidden comment: 1.54M)
RES 1.54M OHM 1% 1/16W 0402; Manufacturer Part Number: RC0402FR-071M54L; Manufacturer: YAGEO; Tolerance: 0.01; Power: 0.063W; Temperature Coefficient: ±100ppm/°C; Object  Type: Part; Design Item ID: R-1.54M-0402; Value: 1.54M; Composition: Thick Film; Features: Moisture Resistant; Operating Temperature: -55°C ~ 155°C; Height - Seated (Max): 0.40mm; Category: Resistor
footprint R0402
pins: 1, 2

## R-1.54M-0603
designator R?, comment Package: 0603  (hidden comment: 1.54M)
RES SMD 1.54M OHM 1% 1/10W 0603; Manufacturer Part Number: CRCW06031M54FKEA; Manufacturer: Vishay Dale; Tolerance: 0.01; Power: 0.1W; Temperature Coefficient: ±100ppm/°C; Object  Type: Part; Design Item ID: R-1.54M-0603; Value: 1.54M; Composition: Thick Film; Features: Automotive AEC-Q200; Operating Temperature: -55°C ~ 155°C; Height - Seated (Max): 0.50mm; Category: Resistor
footprint R0603
pins: 1, 2

## R-1.54R-0603
designator R?, comment Package: 0603  (hidden comment: 1.54R)
RES SMD 1.54 OHM 1% 1/10W 0603; Manufacturer Part Number: CRCW06031R54FKEA; Manufacturer: Vishay Dale; Tolerance: 0.01; Power: 0.1W; Temperature Coefficient: ±100ppm/°C; Object  Type: Part; Design Item ID: R-1.54R-0603; Value: 1.54R; Composition: Thick Film; Features: Automotive AEC-Q200; Operating Temperature: -55°C ~ 155°C; Height - Seated (Max): 0.50mm; Category: Resistor
footprint R0603
pins: 1, 2

## R-1.58K-0402
designator R?, comment Package: 0402  (hidden comment: 1.58K)
RES 1.58K OHM 1% 1/16W 0402; Manufacturer Part Number: RC0402FR-071K58L; Manufacturer: YAGEO; Tolerance: 0.01; Power: 0.063W; Temperature Coefficient: ±100ppm/°C; Object  Type: Part; Design Item ID: R-1.58K-0402; Value: 1.58K; Composition: Thick Film; Features: Moisture Resistant; Operating Temperature: -55°C ~ 155°C; Height - Seated (Max): 0.40mm; Category: Resistor
footprint R0402
pins: 1, 2

## R-1.58K-0603
designator R?, comment Package: 0603  (hidden comment: 1.58K)
RES SMD 1.58K OHM 1% 1/10W 0603; Manufacturer Part Number: CRCW06031K58FKEA; Manufacturer: Vishay Dale; Tolerance: 0.01; Power: 0.1W; Temperature Coefficient: ±100ppm/°C; Object  Type: Part; Design Item ID: R-1.58K-0603; Value: 1.58K; Composition: Thick Film; Features: Automotive AEC-Q200; Operating Temperature: -55°C ~ 155°C; Height - Seated (Max): 0.50mm; Category: Resistor
footprint R0603
pins: 1, 2

## R-1.58M-0402
designator R?, comment Package: 0402  (hidden comment: 1.58M)
RES 1.58M OHM 1% 1/16W 0402; Manufacturer Part Number: RC0402FR-071M58L; Manufacturer: YAGEO; Tolerance: 0.01; Power: 0.063W; Temperature Coefficient: ±100ppm/°C; Object  Type: Part; Design Item ID: R-1.58M-0402; Value: 1.58M; Composition: Thick Film; Features: Moisture Resistant; Operating Temperature: -55°C ~ 155°C; Height - Seated (Max): 0.40mm; Category: Resistor
footprint R0402
pins: 1, 2

## R-1.58M-0603
designator R?, comment Package: 0603  (hidden comment: 1.58M)
RES SMD 1.58M OHM 1% 1/10W 0603; Manufacturer Part Number: CRCW06031M58FKEA; Manufacturer: Vishay Dale; Tolerance: 0.01; Power: 0.1W; Temperature Coefficient: ±100ppm/°C; Object  Type: Part; Design Item ID: R-1.58M-0603; Value: 1.58M; Composition: Thick Film; Features: Automotive AEC-Q200; Operating Temperature: -55°C ~ 155°C; Height - Seated (Max): 0.50mm; Category: Resistor
footprint R0603
pins: 1, 2

## R-1.58R-0603
designator R?, comment Package: 0603  (hidden comment: 1.58R)
RES SMD 1.58 OHM 1% 1/10W 0603; Manufacturer Part Number: CRCW06031R58FKEA; Manufacturer: Vishay Dale; Tolerance: 0.01; Power: 0.1W; Temperature Coefficient: ±100ppm/°C; Object  Type: Part; Design Item ID: R-1.58R-0603; Value: 1.58R; Composition: Thick Film; Features: Automotive AEC-Q200; Operating Temperature: -55°C ~ 155°C; Height - Seated (Max): 0.50mm; Category: Resistor
footprint R0603
pins: 1, 2

## R-1.62K-0402
designator R?, comment Package: 0402  (hidden comment: 1.62K)
RES 1.62K OHM 1% 1/16W 0402; Manufacturer Part Number: RC0402FR-071K62L; Manufacturer: YAGEO; Tolerance: 0.01; Power: 0.063W; Temperature Coefficient: ±100ppm/°C; Object  Type: Part; Design Item ID: R-1.62K-0402; Value: 1.62K; Composition: Thick Film; Features: Moisture Resistant; Operating Temperature: -55°C ~ 155°C; Height - Seated (Max): 0.40mm; Category: Resistor
footprint R0402
pins: 1, 2

## R-1.62K-0603
designator R?, comment Package: 0603  (hidden comment: 1.62K)
RES SMD 1.62K OHM 1% 1/10W 0603; Manufacturer Part Number: CRCW06031K62FKEA; Manufacturer: Vishay Dale; Tolerance: 0.01; Power: 0.1W; Temperature Coefficient: ±100ppm/°C; Object  Type: Part; Design Item ID: R-1.62K-0603; Value: 1.62K; Composition: Thick Film; Features: Automotive AEC-Q200; Operating Temperature: -55°C ~ 155°C; Height - Seated (Max): 0.50mm; Category: Resistor
footprint R0603
pins: 1, 2

## R-1.62M-0402
designator R?, comment Package: 0402  (hidden comment: 1.62M)
RES 1.62M OHM 1% 1/16W 0402; Manufacturer Part Number: RC0402FR-071M62L; Manufacturer: YAGEO; Tolerance: 0.01; Power: 0.063W; Temperature Coefficient: ±100ppm/°C; Object  Type: Part; Design Item ID: R-1.62M-0402; Value: 1.62M; Composition: Thick Film; Features: Moisture Resistant; Operating Temperature: -55°C ~ 155°C; Height - Seated (Max): 0.40mm; Category: Resistor
footprint R0402
pins: 1, 2

## R-1.62M-0603
designator R?, comment Package: 0603  (hidden comment: 1.62M)